# Altium footprint library Ixora.PcbLib: 191 footprints (part 3 of 12)
Each footprint in its own frame and in the unit in brackets; x right, y up, seen from the top. Pads: shape width x height; smd on the part's side, far side on the other; paste and mask are expansions set on the pad; w line width, h text height; cw(c..) or ccw(c..) is an arc to the next point about the centre after c.
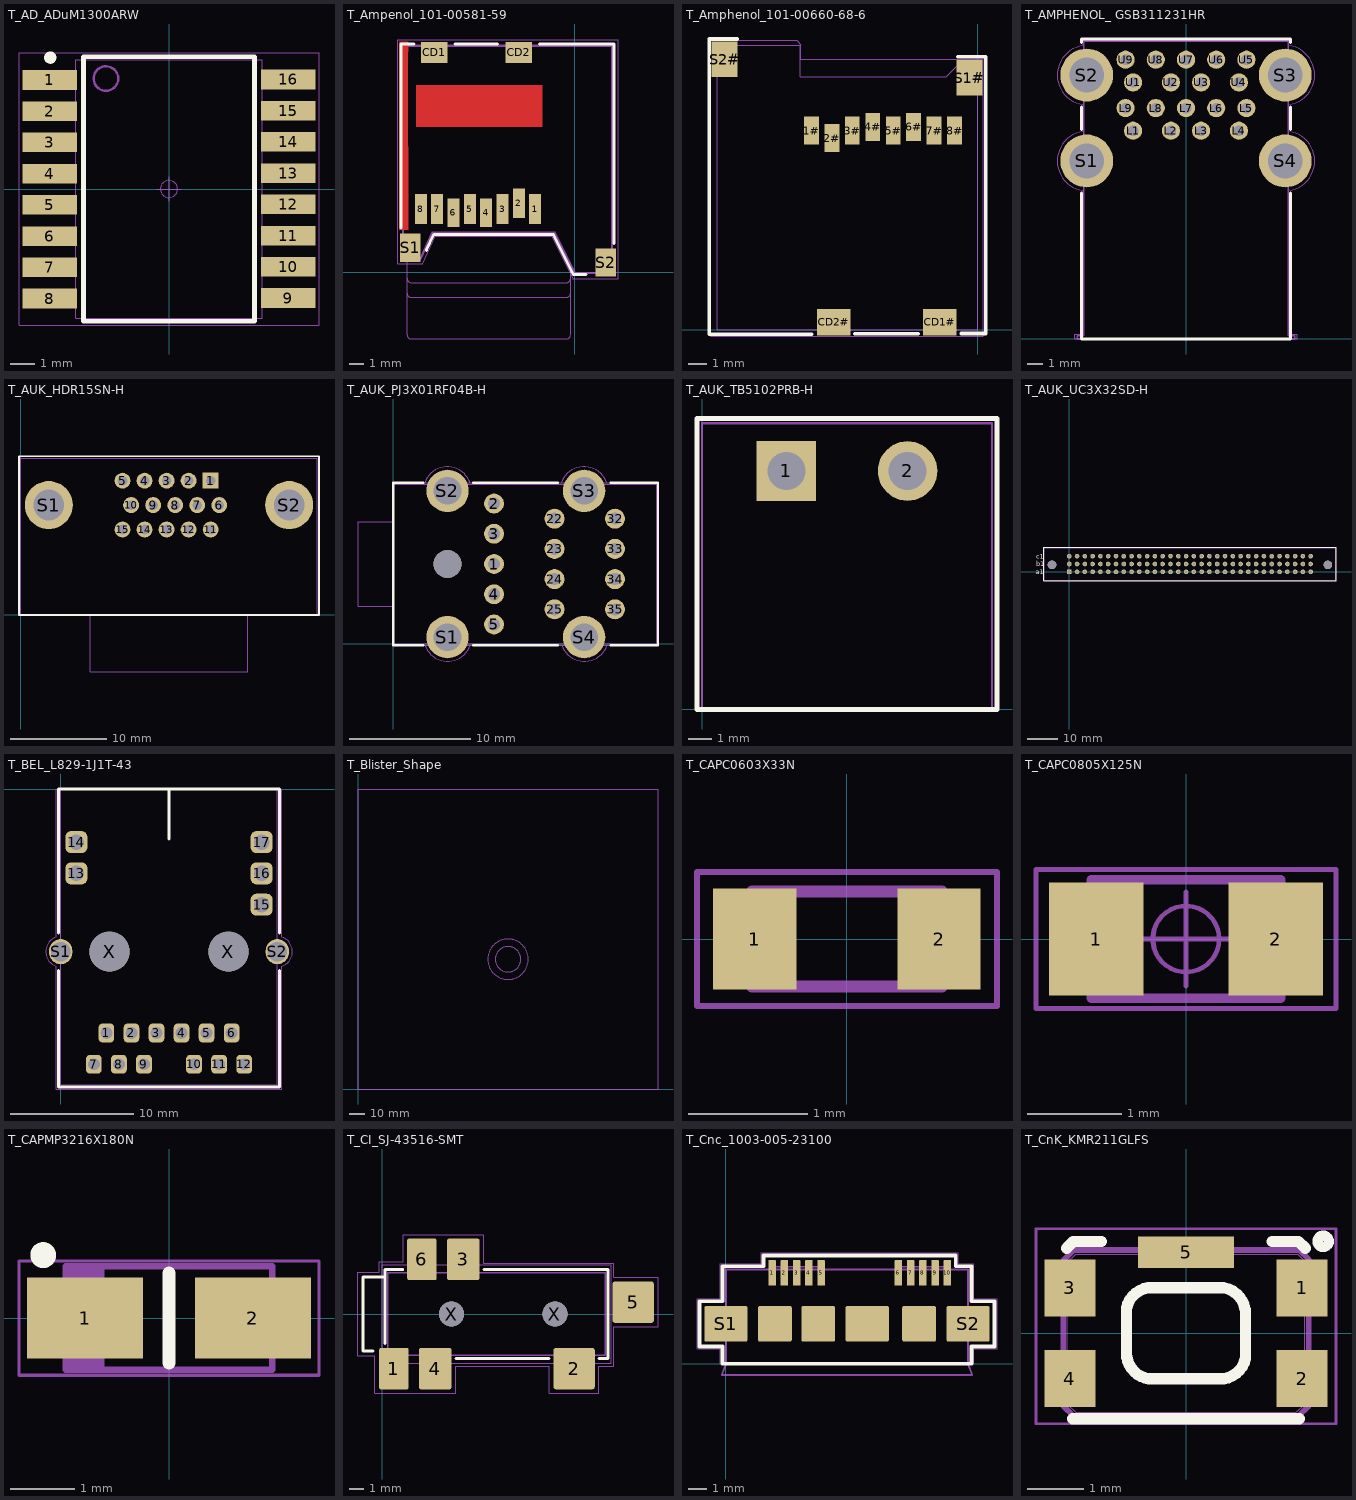
[diagram p2: the footprints below, top view; thin cyan lines are the x and y axes]

## T_AD_ADuM1300ARW [mm] "SOIC _W 16 pin"
height 2.65
pads (16):
  rect 2.2x0.8 smd: 1(-4.85,4.435) 2(-4.85,3.165) 3(-4.85,1.895) 4(-4.85,0.625) 5(-4.85,-0.645) 6(-4.85,-1.915) 7(-4.85,-3.185) 8(-4.85,-4.455) 9(4.85,-4.435) 10(4.85,-3.165) 11(4.85,-1.895) 12(4.85,-0.625) 13(4.85,0.645) 14(4.85,1.915) 15(4.85,3.185) 16(4.85,4.455)
Top Overlay:
  circle w0.25: c-4.829,5.343 r0.125
  lines w0.2: 3.481,-5.378 -3.481,-5.378 -3.481,5.377 3.481,5.377 3.481,-5.377
Mechanical 1:
  circle w0.05: c0,0 r0.35
  lines w0.05: -0.5,0 0.5,0 ; 0,-0.5 0,0.5 ; -6.1,-5.536 6.1,-5.536 6.1,5.535 -6.1,5.535 -6.1,-5.536
Mechanical 2:
  lines w0.001: -3.8,-5.25 -3.8,5.25 3.8,5.25 3.8,-5.25 -3.8,-5.25
Mechanical 3:
  circle w0.1: c-2.565,4.493 r0.5
  lines w0.1: -3.481,-5.378 -3.481,5.377 3.481,5.377 3.481,-5.378 -3.481,-5.378
3D body: height 2.65, standoff 0, extent -3.8,-5.25 3.8,5.25

## T_Ampenol_101-00581-59 [mm] "MicroSD Holder top-loading type"
height 1.8
pads (12):
  rect 0.8x2 smd: 1(-2.67,4.25) 2(-3.77,4.65) 3(-4.87,4.25) 5(-7.07,4.25) 7(-9.27,4.25) 8(-10.37,4.25)
  rect 0.8x1.9 smd: 4(-5.97,4) 6(-8.17,4)
  rect 1.8x1.4 smd: CD1(-9.47,14.8) CD2(-3.77,14.8)
  rect 1.4x1.9 smd: S1(-11.08,1.65) S2(2.08,0.65)
Top Layer:
  pour cut-out: -11.83,15.5 -11.83,2.854 -11.23,2.854 -11.245,14.095 -11.23,15.5
  pour cut-out: -10.68,12.6 -10.68,9.8 -2.18,9.8 -2.18,12.6
Top Overlay:
  lines w0.2: -11.697,2.96 -11.697,15.366 -10.839,15.366 ; -9.998,1.461 -9.496,2.549 -1.448,2.549 -0.105,-0.167 0.753,-0.167 ; -8.055,15.366 -5.197,15.366 ; -2.39,15.366 2.636,15.366 2.636,1.928
Mechanical 1:
  lines w0.05: -11.916,0.564 -10.253,0.564 -9.403,2.407 -1.54,2.407 -0.135,-0.436 2.916,-0.436 2.916,15.636 -11.916,15.636 -11.916,0.564
Mechanical 2:
  lines w0.01: -11.29,-1.425 ccw(c-11.015,-1.425) -11.015,-1.7 -0.565,-1.7 ccw(c-0.565,-1.425) -0.29,-1.425 ; -11.29,-0.428 -11.29,-4.225 ccw(c-11.015,-4.225) -11.015,-4.5 -0.565,-4.5 ccw(c-0.565,-4.225) -0.29,-4.225 -0.29,-0.425 ; -11.29,0.95 -11.29,-0.425 ccw(c-11.015,-0.425) -11.015,-0.7 -0.565,-0.7 ccw(c-0.565,-0.425) -0.29,-0.425 ; -0.29,0.586 -0.29,-0.425 ; -11.53,0.95 -11.53,15.2 2.47,15.2 2.47,0 0,0 -1.346,2.721 -9.608,2.721 -10.424,0.95 -11.53,0.95
Mechanical 3:
  lines w0.1: -10.38,0.876 -11.596,0.876 -11.596,15.266 2.529,15.266 ; -10.379,0.878 -9.563,2.649 ; -9.56,2.649 -1.384,2.649 ; -1.383,2.649 -0.041,-0.066 ; -0.038,-0.068 2.538,-0.068 ; 2.535,-0.045 2.535,15.265 2.529,15.265 ; 2.529,15.265 2.529,15.266
3D body: height 1.26, standoff 0.46, extent -11.29,-4.5 -0.29,2.721
3D body: height 1.72, standoff 0, extent -11.53,0 2.47,15.2

## T_Amphenol_101-00660-68-6 [mm] "MicroSD Holder, Push In, Push Out, Top-loading type"
height 1.88
pads (12):
  rect 0.8x1.5 smd: 1#(-8.94,10.7) 2#(-7.84,10.3) 3#(-6.74,10.7) 4#(-5.64,10.9) 5#(-4.54,10.7) 6#(-3.44,10.9) 7#(-2.34,10.7) 8#(-1.24,10.7)
  rect 1.8x1.4 smd: CD1#(-2.05,0.4) CD2#(-7.75,0.4)
  rect 1.4x1.9 smd: S1#(-0.45,13.55) S2#(-13.6,14.55)
Top Overlay:
  lines w0.2: -12.92,15.63 -14.43,15.63 -14.43,-0.24 -8.92,-0.24 ; -6.6,-0.225 -3.205,-0.225 ; -1.055,14.68 0.43,14.68 0.43,-0.21 -0.885,-0.21
Mechanical 1:
  lines w0.05: -14.35,-0.355 -14.35,15.55 -9.725,15.55 -9.505,15.33 -9.505,14.545 0.3,14.545 0.3,-0.355 -14.35,-0.355
Mechanical 2:
  lines w0.01: -14,0 0,0 0,14.44 -0.72,14.44 ccw(c-0.695,14.09) -0.955,14.325 -1.595,13.685 cw(c-1.825,13.95) -1.8,13.6 -9.55,13.6 -9.55,15.3 -14,15.3 -14,0
Mechanical 3:
  lines w0.05: -14,0.005 -14,15.3 -9.55,15.3 -9.55,13.6 -1.685,13.6 -0.845,14.44 0,14.44 0,0 -13.995,0 -14,0.005
3D body: height 1.92, standoff -0.01, extent -14.025,0 0.025,15.2

## T_AMPHENOL_ GSB311231HR [mm] "USB 3.0 double row, Type A"
height 15.5
pads (22):
  round 1.2 hole 0.7: L1(-3.5,13.78) L2(-1,13.78) L3(1,13.78) L4(3.5,13.78) L5(4,15.28) L6(2,15.28) L7(0,15.28) L8(-2,15.28) L9(-4,15.28) U1(-3.5,16.98) U2(-1,16.98) U3(1,16.98) U4(3.5,16.98) U5(4,18.48) U6(2,18.48) U7(0,18.48) U8(-2,18.48) U9(-4,18.48)
  round 3.5 hole 2.3: S1(-6.57,11.78) S2(-6.57,17.46) S3(6.57,17.46) S4(6.57,11.78)
Top Overlay:
  lines w0.2: -6.9,9.65 -6.9,0 6.9,0 6.9,9.65 ; -6.9,13.85 -6.9,15.35 ; -6.9,19.63 -6.9,19.85 6.9,19.85 6.9,19.63 ; 6.9,13.85 6.9,15.35
Mechanical 1:
  lines w0.05: -6.809,9.837 -6.809,0.3 -7.349,0.3 -7.349,0 7.349,0 7.349,0.3 6.81,0.3 6.809,9.838 ; -6.809,13.725 -6.809,15.515 ; -6.809,9.837 cw(c-6.565,11.779) -6.809,13.722 ; -6.809,15.517 cw(c-6.565,17.459) -6.809,19.402 -6.809,19.76 6.809,19.76 6.809,19.403 ; 6.809,9.838 ccw(c6.565,11.781) 6.809,13.723 ; 6.809,15.518 ccw(c6.565,17.461) 6.809,19.403 ; 6.809,13.725 6.809,15.515
Mechanical 2:
  lines w0.01: -6.753,19.7 6.747,19.7 ; -6.75,19.7 -6.75,0.2 -7.2,0.2 -7.2,0 7.2,0 7.2,0.2 ; 6.75,19.7 6.75,0.2 7.2,0.2
Mechanical 3:
  lines w0.1: -7.2,0 7.2,0 7.2,0.2 6.75,0.2 6.75,19.7 -6.75,19.7 -6.75,0.2 -7.2,0.2 -7.2,0
3D body: height 16.13, standoff -3.49, extent -7.795,0 7.795,19.7

## T_AUK_HDR15SN-H [mm] "15 pin male D-SUB connector"
height 12.55
pads (17):
  rect 1.65x1.65 hole 1: 1(19.73,13.97)
  round 1.65 hole 1: 2(17.44,13.97) 3(15.15,13.97) 4(12.86,13.97) 5(10.57,13.97) 6(20.62,11.43) 7(18.33,11.43) 8(16.04,11.43) 9(13.75,11.43) 10(11.46,11.43) 11(19.73,8.89) 12(17.44,8.89) 13(15.15,8.89) 14(12.86,8.89) 15(10.57,8.89)
  round 5 hole 3.2: S1(2.9,11.43) S2(27.9,11.43)
Top Overlay:
  lines w0.2: -0.2,0 31,0 31,16.505 -0.2,16.505 -0.2,0
Mechanical 1:
  lines w0.05: 0,0 30.8,0 30.8,16.3 0,16.3 0,0
Mechanical 2:
  lines w0.001: 7.235,0 7.235,-5.9 23.565,-5.9 23.565,0 ; 30.8,0 30.8,16.3 0,16.3 0,0 30.819,0
Mechanical 3:
  lines w0.1: 0,0 0,16.3 30.8,16.3 30.8,0 0,0
3D body: height 12.6, standoff -3.17, extent -0.006,-5.893 30.81,16.231

## T_AUK_PJ3X01RF04B-H [mm] "Audio Jack Triple Stacked DIP Type"
height 37
pads (18):
  round 1.65 hole 1: 1(8.35,6.6) 2(8.35,11.6) 3(8.35,9.1) 4(8.35,4.1) 5(8.35,1.6) 22(13.35,10.35) 23(13.35,7.85) 24(13.35,5.35) 25(13.35,2.85) 32(18.35,10.35) 33(18.35,7.85) 34(18.35,5.35) 35(18.35,2.85)
  round 3.5 hole 2.3: S1(4.5,0.55) S2(4.5,12.65) S3(15.8,12.65) S4(15.8,0.55)
  round 2.3 hole 2.3 unplated: ""(4.5,6.6)
Top Overlay:
  lines w0.2: 0,-0.105 2.5,-0.105 ; 0,-0.082 0,13.305 2.5,13.305 ; 6.625,-0.105 13.625,-0.105 ; 6.625,13.305 13.625,13.305 ; 18,-0.105 21.903,-0.105 21.905,-0.105 21.905,13.305 18,13.305
Mechanical 1:
  lines w0.05: 2.604,13.299 cw(c4.484,12.666) 6.363,13.301 ; 2.604,13.3 0,13.3 0,-0.1 2.637,-0.1 ; 2.637,-0.101 ccw(c4.516,0.533) 6.396,-0.099 ; 6.363,13.3 13.904,13.3 ; 6.396,-0.1 13.937,-0.1 ; 13.904,13.299 cw(c15.784,12.666) 17.663,13.301 ; 13.937,-0.101 ccw(c15.816,0.533) 17.696,-0.099 ; 17.663,13.3 21.9,13.3 21.9,-0.1 17.696,-0.1
Mechanical 2:
  lines w0.001: 0,3.1 -2.9,3.1 -2.9,10.1 0,10.1 ; 0,0 21.8,0 21.8,13.2 0,13.2 0,0
Mechanical 3:
  lines w0.1: 0,-0.1 21.901,-0.1 ; 0,13.3 21.9,13.3 21.902,13.298 21.902,-0.1 ; 0.001,-0.074 0.001,13.326 ; 21.901,-0.1 21.902,-0.1
3D body: height 38.5, standoff 0, extent 0,0 21.8,13.2
3D body: height 8.51, standoff 1.49, extent -2.9,3.1 0,10.1
3D body: height 33.51, standoff 26.49, extent -2.9,3.1 0,10.1
3D body: height 21.01, standoff 13.99, extent -2.9,3.1 0,10.1
3D body: height 6.5, standoff 3.5, extent -2.905,5.105 0.01,8.093
3D body: height 19, standoff 16, extent -2.905,5.105 0.01,8.093
3D body: height 31.5, standoff 28.5, extent -2.905,5.105 0.01,8.093

## T_AUK_TB5102PRB-H [mm] "Power Connector 5.08mm pitch"
height 8.4
pads (2):
  rect 2.5x2.5 hole 1.6: 1(3.54,10)
  round 2.5 hole 1.6: 2(8.62,10)
Top Overlay:
  lines w0.2: -0.21,0 -0.21,12.2 12.37,12.2 12.37,0 -0.21,0
Mechanical 1:
  lines w0.05: 0,0 0,12 12.16,12 12.16,0 0,0
Mechanical 2:
  lines w0.001: 0,0 0,12 12.16,12 12.16,0 0,0
Mechanical 3:
  lines w0.1: 0,0 0,12 12.16,12 12.16,0 0,0
3D body: height 8.37, standoff -3.48, extent -0.16,0 11.82,12

## T_AUK_UC3X32SD-H [mm] "Header, 3x32 Pins, 2.54 mm pitch"
height 11.6
pads (98):
  rect 1.5x1.5 hole 1: A1(0,0)
  round 1.5 hole 1: A2(2.54,0) A3(5.08,0) A4(7.62,0) A5(10.16,0) A6(12.7,0) A7(15.24,0) A8(17.78,0) A9(20.32,0) A10(22.86,0) A11(25.4,0) A12(27.94,0) A13(30.48,0) A14(33.02,0) A15(35.56,0) A16(38.1,0) A17(40.64,0) A18(43.18,0) A19(45.72,0) A20(48.26,0) A21(50.8,0) A22(53.34,0) A23(55.88,0) A24(58.42,0) A25(60.96,0) A26(63.5,0) A27(66.04,0) A28(68.58,0) A29(71.12,0) A30(73.66,0) A31(76.2,0) A32(78.74,0) B1(0,2.54) B2(2.54,2.54) B3(5.08,2.54) B4(7.62,2.54) B5(10.16,2.54) B6(12.7,2.54) B7(15.24,2.54) B8(17.78,2.54) B9(20.32,2.54) B10(22.86,2.54) B11(25.4,2.54) B12(27.94,2.54) B13(30.48,2.54) B14(33.02,2.54) B15(35.56,2.54) B16(38.1,2.54) B17(40.64,2.54) B18(43.18,2.54) B19(45.72,2.54) B20(48.26,2.54) B21(50.8,2.54) B22(53.34,2.54) B23(55.88,2.54) B24(58.42,2.54) B25(60.96,2.54) B26(63.5,2.54) B27(66.04,2.54) B28(68.58,2.54) B29(71.12,2.54) B30(73.66,2.54) B31(76.2,2.54) B32(78.74,2.54) C1(0,5.08) C2(2.54,5.08) C3(5.08,5.08) C4(7.62,5.08) C5(10.16,5.08) C6(12.7,5.08) C7(15.24,5.08) C8(17.78,5.08) C9(20.32,5.08) C10(22.86,5.08) C11(25.4,5.08) C12(27.94,5.08) C13(30.48,5.08) C14(33.02,5.08) C15(35.56,5.08) C16(38.1,5.08) C17(40.64,5.08) C18(43.18,5.08) C19(45.72,5.08) C20(48.26,5.08) C21(50.8,5.08) C22(53.34,5.08) C23(55.88,5.08) C24(58.42,5.08) C25(60.96,5.08) C26(63.5,5.08) C27(66.04,5.08) C28(68.58,5.08) C29(71.12,5.08) C30(73.66,5.08) C31(76.2,5.08) C32(78.74,5.08)
  round 2.8 hole 2.8 unplated: ""(-5.63,2.24) ""(84.37,2.24)
Top Overlay:
  lines w0.2: -8.255,-2.885 -8.255,7.963 86.995,7.963 86.995,-2.885 -8.255,-2.885
  text "a1" at -10.847,-0.758 h1.52
  text "b1" at -10.84,1.778 h1.52
  text "c1" at -10.84,4.318 h1.52
Mechanical 1:
  lines w0.05: -8.205,-2.835 86.945,-2.835 86.945,7.915 -8.205,7.915 -8.205,-2.835
Mechanical 2:
  lines w0.001: -8.13,-2.71 86.87,-2.71 86.87,7.79 -8.13,7.79 -8.13,-2.71
Mechanical 3:
  lines w0.1: -8.13,-2.76 -8.13,7.84 86.87,7.84 86.87,-2.76 -8.13,-2.76
3D body: height 11.62, standoff -3.98, extent -8.13,-2.76 86.87,7.84

## T_BEL_L829-1J1T-43 [mil] "LOW PROFILE GIGABIT ETHERNET JACK WITH MAGS"
height 445
pads (21):
  rrect50% 50x60 hole 38: 1(146,-779.68) 2(226,-779.68) 3(306,-779.68) 4(386,-779.68) 5(466,-779.68) 6(546,-779.68) 7(106,-879.68) 8(186,-879.68) 9(266,-879.68) 10(426,-879.68) 11(506,-879.68) 12(586,-879.68)
  rrect50% 70x70 hole 50: 13(50,-269.69) 14(50,-169.69) 15(642,-369.69) 16(642,-269.69) 17(642,-169.69)
  oval 74x80 hole 62: S1(0,-519.68) S2(692,-519.68)
  round 128 hole 128 unplated: X(156,-519.68) X(536,-519.68)
Top Overlay:
  lines w10: -6.95,-579.68 -6.95,-951.77 699.02,-951.77 699.02,-579.68 ; -6.95,-459.49 -6.95,0 699.02,0 699.02,-460 ; 346,-159.69 346,-0.06 346.06,0
Mechanical 1:
  lines w1.97: -13.78,-473.23 -13.78,0 705.91,0 705.91,-473.24 ; -13.76,-473.28 ccw(c0.2,-519.71) -13.78,-566.13 -13.78,-958.66 705.91,-958.66 705.91,-566.09 ; 705.89,-566.05 ccw(c691.8,-519.66) 705.89,-473.28
Mechanical 2:
  lines w0.04: 0,-944.88 0,0 692.13,0 692.13,-944.88 0,-944.88
Mechanical 3:
  lines w3.94: 0,-944.88 0,0 692.13,0 692.13,-944.88 0,-944.88
3D body: height 493.58, standoff -151.39, extent -54.94,-946.68 747.01,19.67

## T_Blister_Shape [mm]
Mechanical 2:
  circle w0.254: c100,86.5 r8.5
  circle w0.254: c100,86.5 r13.5
Mechanical 15:
  lines w0.01: 0,0 200,0 200,200 0,200 0,0
3D body: height 24.9, standoff 22.4, extent 87.549,74.025 112.451,98.975
3D body: height 22.1, standoff 19.6, extent 88.047,74.524 111.953,98.476
3D body: height 19.3, standoff 16.8, extent 88.545,75.023 111.455,97.977
3D body: height 16.5, standoff 14, extent 89.043,75.522 110.957,97.478
3D body: height 13.7, standoff 11.2, extent 89.541,76.021 110.459,96.979
3D body: height 10.9, standoff 8.4, extent 90.039,76.52 109.961,96.48
3D body: height 27.7, standoff 25.2, extent 86.553,73.027 113.447,99.973
3D body: height 8.1, standoff 5.6, extent 90.537,77.019 109.463,95.981
3D body: height 5.3, standoff 2.8, extent 91.035,77.518 108.965,95.482
3D body: height 2.8, standoff 0, extent 91.534,78.017 108.466,94.983

## T_CAPC0603X33N [mm]
height 0.8
pads (2):
  rect 0.7x0.85 smd: 1(-0.775,0) 2(0.775,0)
Mechanical 1:
  lines w0.05: -1.261,-0.563 -1.261,0.563 1.262,0.563 1.262,-0.563 -1.261,-0.563
Mechanical 2:
  lines w0.001: -0.8,-0.4 -0.8,0.4 0.8,0.4 0.8,-0.4 -0.8,-0.4
Mechanical 3:
  lines w0.1: -0.8,-0.4 -0.8,0.4 0.8,0.4 0.8,-0.4 -0.8,-0.4
3D body: height 0.9, standoff 0, extent -0.8,-0.4 0.8,0.4

## T_CAPC0805X125N [mm]
height 1.25
pads (2):
  rect 1x1.2 smd: 1(-0.95,0) 2(0.95,0)
Mechanical 1:
  circle w0.05: c0,0 r0.35
  lines w0.05: -0.5,0 0.5,0 ; 0,-0.5 0,0.5 ; -1.586,-0.736 1.586,-0.736 1.586,0.736 -1.586,0.736 -1.586,-0.736
Mechanical 2:
  lines w0.001: -1,-0.625 -1,0.625 1,0.625 1,-0.625 -1,-0.625
Mechanical 3:
  lines w0.1: -1,-0.625 1,-0.625 1,0.625 -1,0.625 -1,-0.625
3D body: height 1.4, standoff 0, extent -1,-0.625 1,0.625

## T_CAPMP3216X180N [mm]
height 1.6
pads (2):
  rect 1.8x1.25 smd: 1(-1.3,0) 2(1.3,0)
Top Overlay:
  circle w0.3: c-1.95,0.975 r0.05
  lines w0.2: 0,-0.699 0,0.699
Mechanical 1:
  lines w0.05: -2.325,-0.886 -2.325,0.886 2.325,0.886 2.325,-0.886 -2.325,-0.886
Mechanical 2:
  lines w0.001: -1.6,-0.8 1.6,-0.8 1.6,0.8 -1.6,0.8 -1.6,-0.8
Mechanical 3:
  lines w0.1: -1.55,-0.8 -1.55,0.8 ; -1.45,-0.8 -1.45,0.8 ; -1.35,-0.8 -1.35,0.8 ; -1.25,-0.8 -1.25,0.8 ; -1.15,-0.8 -1.15,0.8 ; -1.05,-0.8 -1.05,0.8 ; -1.6,-0.8 1.6,-0.8 1.6,0.8 -1.6,0.8 -1.6,-0.8
3D body: height 1.6, standoff 0, extent -1,-0.8 1.6,0.8
3D body: height 1.6, standoff 0, extent -1.6,-0.8 -1,0.8

## T_CI_SJ-43516-SMT [mm] "STEREO_3.5mm AUDIO JACK  CUI"
height 5
pads (8):
  rrect12% 2x2.8 smd: 1(0.8,-3.7) 6(2.7,3.7)
  rrect12% 2.8x2.8 smd: 2(13,-3.7) 5(17,0.8)
  rrect12% 2.2x2.8 smd: 3(5.5,3.7) 4(3.6,-3.7)
  round 1.7 hole 1.7 unplated: X(4.7,0) X(11.7,0)
Top Overlay:
  lines w0.2: -0.6,-2.5 -1.3,-2.5 -1.3,2.5 0.2,2.5 ; 0.2,-2 0.2,3 1.4,3 ; 5,-3 11.3,-3 ; 6.9,3 15.3,3 15.3,-3 14.7,-3
Mechanical 1:
  lines w0.05: -1.63,-2.83 -1.63,2.83 -0.19,2.83 -0.19,3.53 1.42,3.53 1.42,5.38 6.88,5.38 6.88,3.45 15.68,3.45 15.68,2.48 18.68,2.48 18.68,-0.87 15.68,-0.87 15.68,-3.53 14.68,-3.53 14.68,-5.38 11.32,-5.38 11.32,-3.53 4.98,-3.53 4.98,-5.38 -0.48,-5.38 -0.48,-2.83 -1.63,-2.83
Mechanical 2:
  lines w0.001: 0,-3.35 0,3.35 15.5,3.35 15.5,-3.35 0,-3.35
Mechanical 3:
  lines w0.1: 0.4,-2.8 15.1,-2.8 15.1,2.8 0.4,2.8 0.4,-2.8
3D body: height 5.12, standoff -0.68, extent -1.5,-4.5 17.7,4.5

## T_Cnc_1003-005-23100 [mm] "USB Micro A/B 3.0"
height 2.92
pads (16):
  rrect12% 0.4x1.35 smd: 1(2.45,4.825) 2(3.1,4.825) 3(3.75,4.825) 4(4.4,4.825) 5(5.05,4.825) 6(9.15,4.825) 7(9.8,4.825) 8(10.45,4.825) 9(11.1,4.825) 10(11.75,4.825)
  rrect12% 2.3x1.9 smd: S1(0,2.125) S2(12.85,2.125) ""(7.5,2.125)
  rrect12% 1.8x1.9 smd: ""(2.6,2.125) ""(4.9,2.125) ""(10.25,2.125)
Top Overlay:
  lines w0.2: -1.4,0.925 -0.175,0.925 -0.175,0 13.025,0 13.025,0.925 14.25,0.925 14.25,3.325 13.025,3.325 13.025,5.175 12.2,5.175 12.2,5.755 2,5.755 2,5.175 -0.175,5.175 -0.175,3.325 -1.4,3.325 -1.4,0.925
Mechanical 1:
  lines w0.05: -1.535,0.79 -0.31,0.79 -0.31,0 13.16,0 13.16,0.79 14.385,0.79 14.385,3.46 13.16,3.46 13.16,5.31 12.335,5.31 12.335,5.89 1.865,5.89 1.865,5.31 -0.31,5.31 -0.31,3.46 -1.535,3.46 -1.535,0.79
Mechanical 2:
  lines w0.001: 0,1.675 -0.64,1.675 -0.64,2.575 0,2.575 ; 2.35,5 2.35,5.15 5.15,5.15 5.15,5 ; 9.05,5 9.05,5.15 11.85,5.15 11.85,5 ; 12.85,1.675 13.49,1.675 13.49,2.575 12.85,2.575 ; 0,0 12.85,0 ; 0,0 -0.22,-0.6 13.07,-0.6 12.85,0 ; 0,0 0,5 12.85,5 12.85,0
Mechanical 3:
  lines w0.1: 0,1.675 -0.64,1.675 -0.64,2.575 0,2.575 ; 2.35,5 2.35,5.15 5.15,5.15 5.15,5 ; 9.05,5 9.05,5.15 11.85,5.15 11.85,5 ; 12.85,1.675 13.49,1.675 13.49,2.575 12.85,2.575 ; 0,0 12.85,0 ; 0,0 0,5 12.85,5 12.85,0 ; 0,0 -0.22,-0.6 13.07,-0.6 12.85,0
3D body: height 2.78, standoff -0.24, extent -0.65,-0.624 13.5,5.05

## T_CnK_KMR211GLFS [mm] "Microminiature Tact Switch for SMT"
height 1.9
pads (5):
  rect 0.9x1 smd: 1(2.05,0.8) 2(2.05,-0.8) 3(-2.05,0.8) 4(-2.05,-0.8)
  rect 1.7x0.55 smd: 5(0,1.43)
Top Overlay:
  circle w0.18: c2.424,1.624 r0.1
  lines w0.2: -2.109,1.502 -1.991,1.62 -1.5,1.62 ; -2,-1.51 2,-1.51 ; -1.05,-0.36 -1.05,0.44 ; -1.05,-0.35 ccw(c-0.59,-0.35) -0.662,-0.804 ; -1.05,0.444 cw(c-0.6,0.35) -0.669,0.805 ; -0.66,0.805 0.66,0.805 ; -0.655,-0.805 0.65,-0.805 ; 0.669,-0.805 ccw(c0.6,-0.35) 1.05,-0.444 ; 0.684,0.8 cw(c0.59,0.35) 1.045,0.419 ; 1.05,-0.44 1.05,0.4 ; 1.52,1.621 1.989,1.621 2.108,1.502
Mechanical 1:
  lines w0.05: -2.65,-1.6 2.65,-1.6 2.65,1.845 -2.65,1.845 -2.65,-1.6
Mechanical 2:
  lines w0.001: -2.1,-1.25 -1.95,-1.4 1.95,-1.4 2.1,-1.25 2.1,1.27 1.97,1.4 -1.95,1.4 -2.1,1.25 -2.1,-1.25
Mechanical 3:
  lines w0.1: -2.17,-1.28 -1.98,-1.47 1.98,-1.47 2.17,-1.28 2.17,1.3 2,1.47 -1.98,1.47 -2.17,1.28 -2.17,-1.28